# Altium footprint library SG__PCB_HOLE_Connector.PcbLib: 174 footprints (part 10 of 11)
Each footprint in its own frame and in the unit in brackets; x right, y up, seen from the top. Pads: shape width x height; smd on the part's side, far side on the other; paste and mask are expansions set on the pad; w line width, h text height; cw(c..) or ccw(c..) is an arc to the next point about the centre after c.
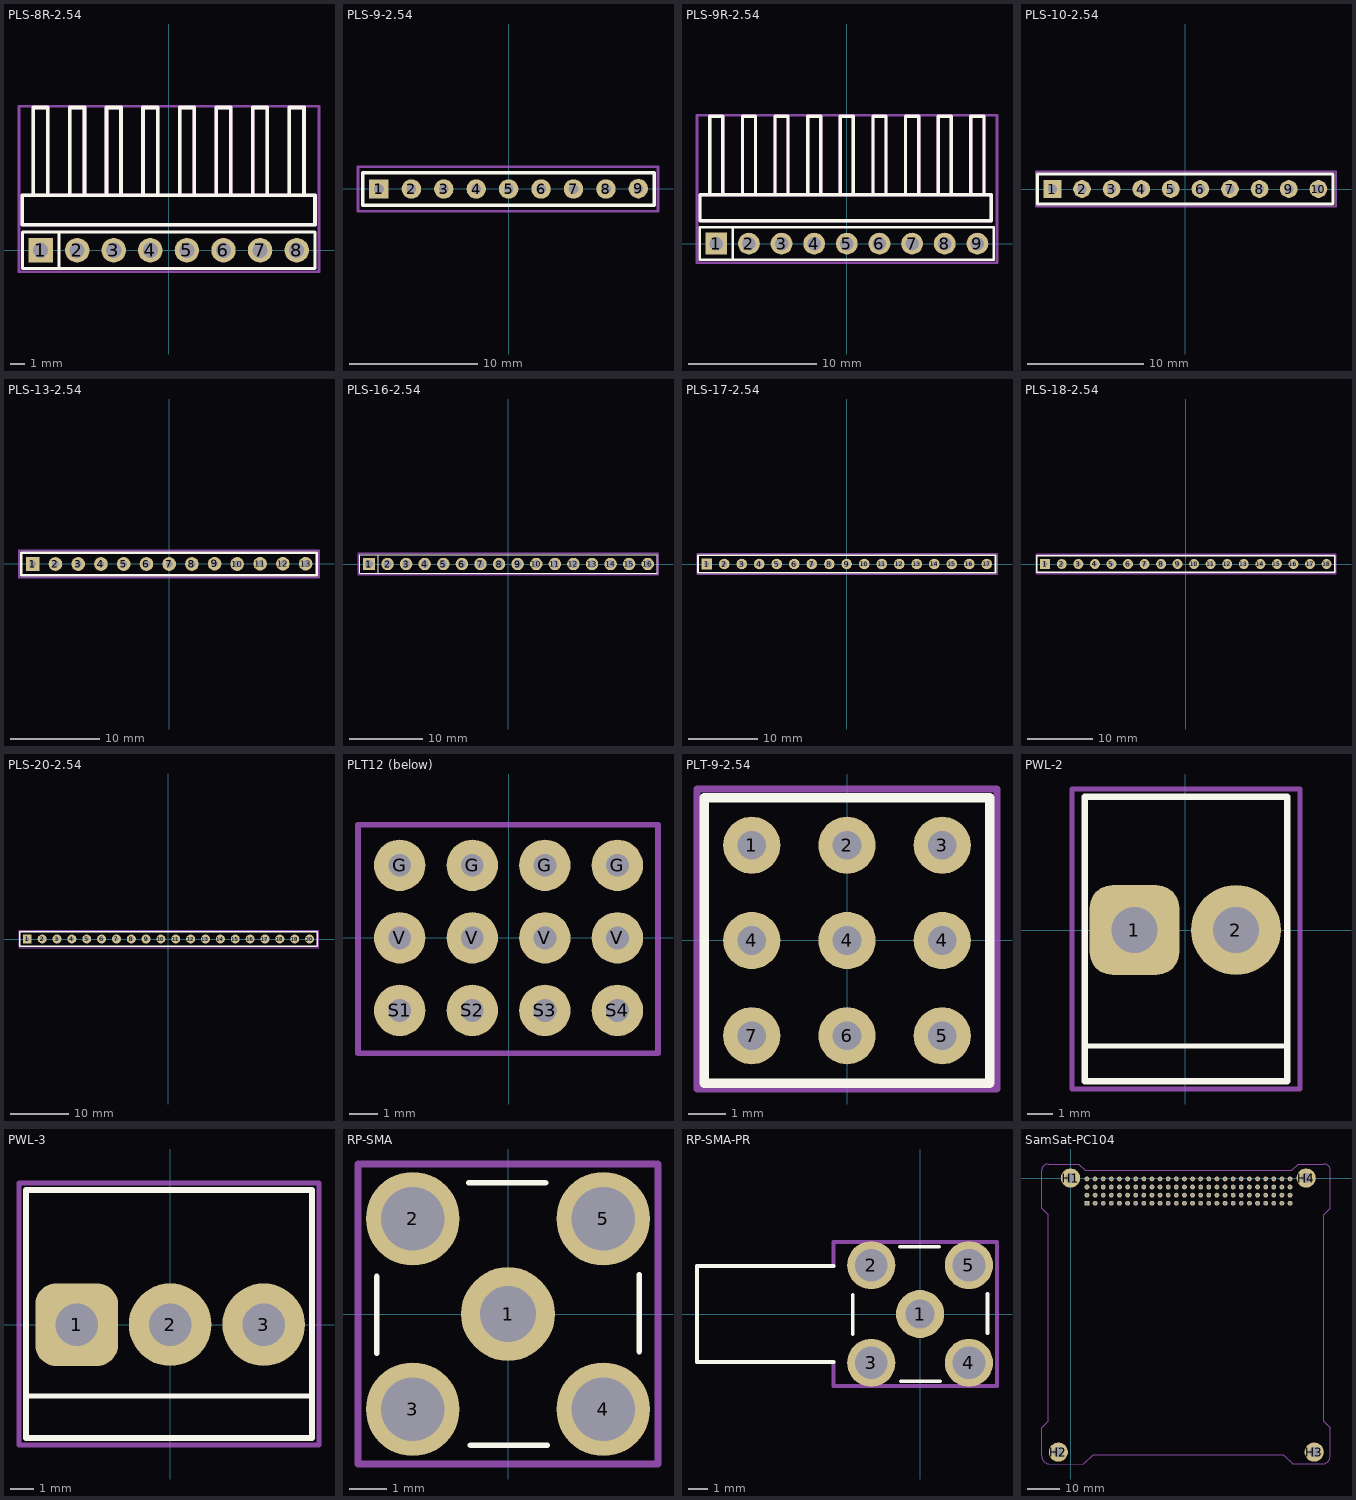
[diagram p9: the footprints below, top view; thin cyan lines are the x and y axes]

## PLS-8R-2.54 [mm]
pads (8):
  rect 1.7x1.7 hole 1.05 mask+0.05: 1(-8.89,0)
  round 1.7 hole 1.05 mask+0.05: 2(-6.35,0) 3(-3.81,0) 4(-1.27,0) 5(1.27,0) 6(3.81,0) 7(6.35,0) 8(8.89,0)
Top Overlay:
  lines w0.2: -7.62,-1.27 -7.62,1.27 ; -10.16,-1.27 -10.16,1.27 10.16,1.27 10.16,-1.27 -10.16,-1.27
  lines w0.254: -9.398,3.81 -9.398,9.906 -8.382,9.906 -8.382,3.81 ; -6.858,3.81 -6.858,9.906 -5.842,9.906 -5.842,3.81 ; -4.318,3.81 -4.318,9.906 -3.302,9.906 -3.302,3.81 ; -1.778,3.81 -1.778,9.906 -0.762,9.906 -0.762,3.81 ; 0.762,3.81 0.762,9.906 1.778,9.906 1.778,3.81 ; 3.302,3.81 3.302,9.906 4.318,9.906 4.318,3.81 ; 5.842,3.81 5.842,9.906 6.858,9.906 6.858,3.81 ; 8.382,3.81 8.382,9.906 9.398,9.906 9.398,3.81 ; -10.16,1.778 -10.16,3.81 10.16,3.81 10.16,1.778 -10.16,1.778
Top Assembly:
  lines w0.254: -9.398,3.81 -9.398,9.906 -8.382,9.906 -8.382,3.81 ; -6.858,3.81 -6.858,9.906 -5.842,9.906 -5.842,3.81 ; -4.318,3.81 -4.318,9.906 -3.302,9.906 -3.302,3.81 ; -1.778,3.81 -1.778,9.906 -0.762,9.906 -0.762,3.81 ; 0.762,3.81 0.762,9.906 1.778,9.906 1.778,3.81 ; 3.302,3.81 3.302,9.906 4.318,9.906 4.318,3.81 ; 5.842,3.81 5.842,9.906 6.858,9.906 6.858,3.81 ; 8.382,3.81 8.382,9.906 9.398,9.906 9.398,3.81 ; -10.16,1.778 -10.16,3.81 10.16,3.81 10.16,1.778 -10.16,1.778
Top Courtyard:
  lines w0.2: -10.39,-1.5 10.442,-1.5 10.442,10 -10.39,10 -10.39,-1.5
3D body "PLS-1R_D1.STEP": height 3, standoff -2.5, extent -10.16,-0.354 -7.62,10.006
3D body "PLS-1R_D1.STEP": height 3, standoff -2.5, extent -7.62,-0.32 -5.08,10.04
3D body "PLS-1R_D1.STEP": height 3, standoff -2.5, extent -5.08,-0.32 -2.54,10.04
3D body "PLS-1R_D1.STEP": height 3, standoff -2.5, extent -2.54,-0.32 0,10.04
3D body "PLS-1R_D1.STEP": height 3, standoff -2.5, extent 0,-0.32 2.54,10.04
3D body "PLS-1R_D1.STEP": height 3, standoff -2.5, extent 2.54,-0.32 5.08,10.04
3D body "PLS-1R_D1.STEP": height 3, standoff -2.5, extent 5.08,-0.32 7.62,10.04
3D body "PLS-1R_D1.STEP": height 3, standoff -2.5, extent 7.636,-0.32 10.176,10.04

## PLS-9-2.54 [mil]
pads (9):
  rect 60x60 hole 30: 1(-399.91,-0.5)
  round 60 hole 30: 2(-299.91,-0.5) 3(-199.91,-0.5) 4(-99.91,-0.5) 5(0.09,-0.5) 6(100.09,-0.5) 7(200.09,-0.5) 8(300.09,-0.5) 9(399.91,0.5)
Top Overlay:
  lines w10: -54.24,-50.5 448.91,-50.5 448.91,49.5 348.91,49.5 -54.24,49.5 ; -49.91,-50.5 -449.91,-50.5 -449.91,49.5 -49.91,49.5
Top Courtyard:
  lines w7.87: -464.48,-69.4 460.72,-69.4 460.72,68.4 -464.48,68.4 -464.48,-69.4
3D body "PLS1.stp": height 336.22, standoff -118.11, extent 349.91,-49.5 449.91,50.5
3D body "PLS1.stp": height 336.22, standoff -118.11, extent -449.91,-50.5 -349.91,49.5
3D body "PLS1.stp": height 336.22, standoff -118.11, extent -349.91,-50.5 -249.91,49.5
3D body "PLS1.stp": height 336.22, standoff -118.11, extent -249.91,-50.5 -149.91,49.5
3D body "PLS1.stp": height 336.22, standoff -118.11, extent -149.91,-50.5 -49.91,49.5
3D body "PLS1.stp": height 336.22, standoff -118.11, extent -49.91,-50.5 50.09,49.5
3D body "PLS1.stp": height 336.22, standoff -118.11, extent 50.09,-50.5 150.09,49.5
3D body "PLS1.stp": height 336.22, standoff -118.11, extent 150.09,-50.5 250.09,49.5
3D body "PLS1.stp": height 336.22, standoff -118.11, extent 250.09,-50.5 350.09,49.5

## PLS-9R-2.54 [mm]
pads (9):
  rect 1.7x1.7 hole 1.05 mask+0.05: 1(-10.16,0)
  round 1.7 hole 1.05 mask+0.05: 2(-7.62,0) 3(-5.08,0) 4(-2.54,0) 5(0,0) 6(2.54,0) 7(5.08,0) 8(7.62,0) 9(10.16,0)
Top Overlay:
  lines w0.2: -8.89,-1.27 -8.89,1.27 ; -11.43,-1.27 11.43,-1.27 11.43,1.27 -11.43,1.27 -11.43,-1.27
  lines w0.254: -10.668,3.81 -10.668,9.906 -9.652,9.906 -9.652,3.81 ; -8.128,3.81 -8.128,9.906 -7.112,9.906 -7.112,3.81 ; -5.588,3.81 -5.588,9.906 -4.572,9.906 -4.572,3.81 ; -3.048,3.81 -3.048,9.906 -2.032,9.906 -2.032,3.81 ; -0.508,3.81 -0.508,9.906 0.508,9.906 0.508,3.81 ; 2.032,3.81 2.032,9.906 3.048,9.906 3.048,3.81 ; 4.572,3.81 4.572,9.906 5.588,9.906 5.588,3.81 ; 7.112,3.81 7.112,9.906 8.128,9.906 8.128,3.81 ; 9.652,3.81 9.652,9.906 10.668,9.906 10.668,3.81 ; -11.43,1.778 11.25,1.778 11.25,3.81 -11.43,3.81 -11.43,1.778
Top Assembly:
  lines w0.254: -10.668,3.81 -10.668,9.906 -9.652,9.906 -9.652,3.81 ; -8.128,3.81 -8.128,9.906 -7.112,9.906 -7.112,3.81 ; -5.588,3.81 -5.588,9.906 -4.572,9.906 -4.572,3.81 ; -3.048,3.81 -3.048,9.906 -2.032,9.906 -2.032,3.81 ; -0.508,3.81 -0.508,9.906 0.508,9.906 0.508,3.81 ; 2.032,3.81 2.032,9.906 3.048,9.906 3.048,3.81 ; 4.572,3.81 4.572,9.906 5.588,9.906 5.588,3.81 ; 7.112,3.81 7.112,9.906 8.128,9.906 8.128,3.81 ; 9.652,3.81 9.652,9.906 10.668,9.906 10.668,3.81 ; -11.43,1.778 -11.43,3.81 11.25,3.81 11.25,1.778 -11.43,1.778
Top Courtyard:
  lines w0.2: -11.66,-1.5 -11.66,10 11.687,10 11.687,-1.5 -11.66,-1.5
3D body "PLS-1R_D1.STEP": height 3, standoff -2.5, extent 8.89,-0.32 11.43,10.04
3D body "PLS-1R_D1.STEP": height 3, standoff -2.5, extent 6.366,-0.32 8.906,10.04
3D body "PLS-1R_D1.STEP": height 3, standoff -2.5, extent 3.81,-0.32 6.35,10.04
3D body "PLS-1R_D1.STEP": height 3, standoff -2.5, extent 1.27,-0.32 3.81,10.04
3D body "PLS-1R_D1.STEP": height 3, standoff -2.5, extent -1.27,-0.32 1.27,10.04
3D body "PLS-1R_D1.STEP": height 3, standoff -2.5, extent -3.81,-0.32 -1.27,10.04
3D body "PLS-1R_D1.STEP": height 3, standoff -2.5, extent -6.35,-0.32 -3.81,10.04
3D body "PLS-1R_D1.STEP": height 3, standoff -2.5, extent -8.89,-0.32 -6.35,10.04
3D body "PLS-1R_D1.STEP": height 3, standoff -2.5, extent -11.43,-0.354 -8.89,10.006

## PLS-10-2.54 [mil]
pads (10):
  rect 60x60 hole 30: 1(-449.41,0)
  round 60 hole 30: 2(-349.41,0) 3(-249.41,0) 4(-149.41,0) 5(-49.41,0) 6(50.59,0) 7(150.59,0) 8(250.59,0) 9(349.41,0) 10(449.41,0)
Top Overlay:
  lines w10: -103.74,-50 499.41,-50 499.41,50 -103.74,50 ; -99.41,-50 -499.41,-50 -499.41,50 -99.41,50
Top Courtyard:
  lines w7.87: -504.92,-59.06 -504.92,59.06 508.86,59.06 508.86,-59.06 -504.92,-59.06
3D body "PLS1.stp": height 336.22, standoff -118.11, extent -499.41,-50 -399.41,50
3D body "PLS1.stp": height 336.22, standoff -118.11, extent -399.41,-50 -299.41,50
3D body "PLS1.stp": height 336.22, standoff -118.11, extent -299.41,-50 -199.41,50
3D body "PLS1.stp": height 336.22, standoff -118.11, extent -199.41,-50 -99.41,50
3D body "PLS1.stp": height 336.22, standoff -118.11, extent -99.41,-50 0.59,50
3D body "PLS1.stp": height 336.22, standoff -118.11, extent 0.59,-50 100.59,50
3D body "PLS1.stp": height 336.22, standoff -118.11, extent 100.59,-50 200.59,50
3D body "PLS1.stp": height 336.22, standoff -118.11, extent 200.59,-50 300.59,50
3D body "PLS1.stp": height 336.22, standoff -118.11, extent 299.41,-50 399.41,50
3D body "PLS1.stp": height 336.22, standoff -118.11, extent 399.41,-50 499.41,50

## PLS-13-2.54 [mil]
pads (13):
  rect 60x60 hole 30: 1(-599.91,-0.5)
  round 60 hole 30: 2(-499.91,-0.5) 3(-399.91,-0.5) 4(-299.91,-0.5) 5(-199.91,-0.5) 6(-99.91,-0.5) 7(0.09,-0.5) 8(100.09,-0.5) 9(199.91,0.5) 10(298.91,-0.5) 11(399.91,0.5) 12(499.91,0.5) 13(599.91,0.5)
Top Overlay:
  lines w10: -254.24,-50.5 648.91,-50.5 648.91,49.5 148.91,49.5 -254.24,49.5 ; -249.91,-50.5 -649.91,-50.5 -649.91,49.5 -249.91,49.5
Top Courtyard:
  lines w7.87: -660.15,-59.56 -660.15,58.56 -650.3,58.56 658.75,58.56 658.75,-59.56 -660.15,-59.56
3D body "PLS1.stp": height 336.22, standoff -118.11, extent -649.91,-50.5 -549.91,49.5
3D body "PLS1.stp": height 336.22, standoff -118.11, extent -549.91,-50.5 -449.91,49.5
3D body "PLS1.stp": height 336.22, standoff -118.11, extent -449.91,-50.5 -349.91,49.5
3D body "PLS1.stp": height 336.22, standoff -118.11, extent -349.91,-50.5 -249.91,49.5
3D body "PLS1.stp": height 336.22, standoff -118.11, extent -249.91,-50.5 -149.91,49.5
3D body "PLS1.stp": height 336.22, standoff -118.11, extent -149.91,-50.5 -49.91,49.5
3D body "PLS1.stp": height 336.22, standoff -118.11, extent -49.91,-50.5 50.09,49.5
3D body "PLS1.stp": height 336.22, standoff -118.11, extent 50.09,-50.5 150.09,49.5
3D body "PLS1.stp": height 336.22, standoff -118.11, extent 249.91,-49.5 349.91,50.5
3D body "PLS1.stp": height 336.22, standoff -118.11, extent 349.91,-49.5 449.91,50.5
3D body "PLS1.stp": height 336.22, standoff -118.11, extent 449.91,-49.5 549.91,50.5
3D body "PLS1.stp": height 336.22, standoff -118.11, extent 549.91,-49.5 649.91,50.5
3D body "PLS1.stp": height 336.22, standoff -118.11, extent 149.91,-49.5 249.91,50.5

## PLS-16-2.54 [mm]
pads (16):
  rect 1.7x1.7 hole 1.05 mask+0.05: 1(-19.05,0)
  round 1.7 hole 1.05 mask+0.05: 2(-16.51,0) 3(-13.97,0) 4(-11.43,0) 5(-8.89,0) 6(-6.35,0) 7(-3.81,0) 8(-1.27,0) 9(1.27,0) 10(3.81,0) 11(6.35,0) 12(8.89,0) 13(11.43,0) 14(13.97,0) 15(16.51,0) 16(19.05,0)
Top Overlay:
  lines w0.15: -17.78,-1.27 -17.78,1.27 ; -20.32,-1.27 20.32,-1.27 20.32,1.27 -20.32,1.27 -20.32,-1.27
Top Courtyard:
  lines w0.2: -20.55,-1.5 -20.55,1.5 20.45,1.5 20.45,-1.5 -20.55,-1.5
3D body "PLS.STEP": height 8.44, standoff -3, extent -15.24,-1.27 -12.7,1.27
3D body "PLS.STEP": height 8.44, standoff -3, extent -20.32,-1.27 -17.78,1.27
3D body "PLS.STEP": height 8.44, standoff -3, extent -17.78,-1.27 -15.24,1.27
3D body "PLS.STEP": height 8.44, standoff -3, extent -12.7,-1.27 -10.16,1.27
3D body "PLS.STEP": height 8.44, standoff -3, extent -10.16,-1.27 -7.62,1.27
3D body "PLS.STEP": height 8.44, standoff -3, extent -7.62,-1.27 -5.08,1.27
3D body "PLS.STEP": height 8.44, standoff -3, extent -5.08,-1.27 -2.54,1.27
3D body "PLS.STEP": height 8.44, standoff -3, extent -2.54,-1.27 0,1.27
3D body "PLS.STEP": height 8.44, standoff -3, extent 0,-1.27 2.54,1.27
3D body "PLS.STEP": height 8.44, standoff -3, extent 2.54,-1.27 5.08,1.27
3D body "PLS.STEP": height 8.44, standoff -3, extent 5.08,-1.27 7.62,1.27
3D body "PLS.STEP": height 8.44, standoff -3, extent 7.62,-1.27 10.16,1.27
3D body "PLS.STEP": height 8.44, standoff -3, extent 10.16,-1.27 12.7,1.27
3D body "PLS.STEP": height 8.44, standoff -3, extent 12.7,-1.27 15.24,1.27
3D body "PLS.STEP": height 8.44, standoff -3, extent 15.24,-1.27 17.78,1.27
3D body "PLS.STEP": height 8.44, standoff -3, extent 17.78,-1.27 20.32,1.27

## PLS-17-2.54 [mil]
pads (17):
  rect 60x60 hole 30: 1(-799.41,0)
  round 60 hole 30: 2(-699.41,0) 3(-599.41,0) 4(-499.41,0) 5(-399.41,0) 6(-299.41,0) 7(-199.41,0) 8(-99.41,0) 9(-0.59,0) 10(99.41,0) 11(199.41,0) 12(299.41,0) 13(399.41,0) 14(499.41,0) 15(599.41,0) 16(699.41,0) 17(799.41,0)
Top Overlay:
  lines w10: -453.74,-50 849.41,-50 849.41,50 -453.74,50 ; -449.41,-50 -849.41,-50 -849.41,50 -449.41,50
Top Courtyard:
  lines w7.87: -854.92,-59.06 857.68,-59.06 857.68,59.06 -854.92,59.06 -854.92,-59.06
3D body "PLS1.stp": height 336.22, standoff -118.11, extent 549.41,-50 649.41,50
3D body "PLS1.stp": height 336.22, standoff -118.11, extent 649.41,-50 749.41,50
3D body "PLS1.stp": height 336.22, standoff -118.11, extent 749.41,-50 849.41,50
3D body "PLS1.stp": height 336.22, standoff -118.11, extent 49.41,-50 149.41,50
3D body "PLS1.stp": height 336.22, standoff -118.11, extent -50.59,-50 49.41,50
3D body "PLS1.stp": height 336.22, standoff -118.11, extent -149.41,-50 -49.41,50
3D body "PLS1.stp": height 336.22, standoff -118.11, extent -249.41,-50 -149.41,50
3D body "PLS1.stp": height 336.22, standoff -118.11, extent -349.41,-50 -249.41,50
3D body "PLS1.stp": height 336.22, standoff -118.11, extent -449.41,-50 -349.41,50
3D body "PLS1.stp": height 336.22, standoff -118.11, extent -549.41,-50 -449.41,50
3D body "PLS1.stp": height 336.22, standoff -118.11, extent -649.41,-50 -549.41,50
3D body "PLS1.stp": height 336.22, standoff -118.11, extent -749.41,-50 -649.41,50
3D body "PLS1.stp": height 336.22, standoff -118.11, extent -849.41,-50 -749.41,50
3D body "PLS1.stp": height 336.22, standoff -118.11, extent 149.41,-50 249.41,50
3D body "PLS1.stp": height 336.22, standoff -118.11, extent 249.41,-50 349.41,50
3D body "PLS1.stp": height 336.22, standoff -118.11, extent 349.41,-50 449.41,50
3D body "PLS1.stp": height 336.22, standoff -118.11, extent 449.41,-50 549.41,50

## PLS-18-2.54 [mil]
pads (18):
  rect 60x60 hole 30: 1(-849.41,0)
  round 60 hole 30: 2(-749.41,0) 3(-649.41,0) 4(-549.41,0) 5(-449.41,0) 6(-349.41,0) 7(-249.41,0) 8(-149.41,0) 9(-50.59,0) 10(49.41,0) 11(149.41,0) 12(249.41,0) 13(349.41,0) 14(449.41,0) 15(549.41,0) 16(649.41,0) 17(749.41,0) 18(849.41,0)
Top Overlay:
  lines w10: -503.74,-50 899.41,-50 899.41,50 -503.74,50 ; -499.41,-50 -899.41,-50 -899.41,50 -499.41,50
Top Courtyard:
  lines w7.87: -904.92,-59.06 -904.92,59.06 906.1,59.06 906.1,-59.06 -904.92,-59.06
3D body "PLS1.stp": height 336.22, standoff -118.11, extent 699.41,-50 799.41,50
3D body "PLS1.stp": height 336.22, standoff -118.11, extent 599.41,-50 699.41,50
3D body "PLS1.stp": height 336.22, standoff -118.11, extent 499.41,-50 599.41,50
3D body "PLS1.stp": height 336.22, standoff -118.11, extent 399.41,-50 499.41,50
3D body "PLS1.stp": height 336.22, standoff -118.11, extent 299.41,-50 399.41,50
3D body "PLS1.stp": height 336.22, standoff -118.11, extent 199.41,-50 299.41,50
3D body "PLS1.stp": height 336.22, standoff -118.11, extent 99.41,-50 199.41,50
3D body "PLS1.stp": height 336.22, standoff -118.11, extent -899.41,-50 -799.41,50
3D body "PLS1.stp": height 336.22, standoff -118.11, extent -799.41,-50 -699.41,50
3D body "PLS1.stp": height 336.22, standoff -118.11, extent -699.41,-50 -599.41,50
3D body "PLS1.stp": height 336.22, standoff -118.11, extent -599.41,-50 -499.41,50
3D body "PLS1.stp": height 336.22, standoff -118.11, extent -499.41,-50 -399.41,50
3D body "PLS1.stp": height 336.22, standoff -118.11, extent -399.41,-50 -299.41,50
3D body "PLS1.stp": height 336.22, standoff -118.11, extent -299.41,-50 -199.41,50
3D body "PLS1.stp": height 336.22, standoff -118.11, extent -199.41,-50 -99.41,50
3D body "PLS1.stp": height 336.22, standoff -118.11, extent -100.59,-50 -0.59,50
3D body "PLS1.stp": height 336.22, standoff -118.11, extent -0.59,-50 99.41,50
3D body "PLS1.stp": height 336.22, standoff -118.11, extent 799.41,-50 899.41,50

## PLS-20-2.54 [mil]
pads (20):
  rect 60x60 hole 30: 1(-949.41,0)
  round 60 hole 30: 2(-849.41,0) 3(-749.41,0) 4(-649.41,0) 5(-549.41,0) 6(-449.41,0) 7(-349.41,0) 8(-249.41,0) 9(-150.59,0) 10(-50.59,0) 11(49.41,0) 12(149.41,0) 13(249.41,0) 14(349.41,0) 15(449.41,0) 16(549.41,0) 17(649.41,0) 18(749.41,0) 19(849.41,0) 20(949.41,0)
Top Overlay:
  lines w10: -603.74,-50 999.41,-50 999.41,50 -603.74,50 ; -599.41,-50 -999.41,-50 -999.41,50 -599.41,50
Top Courtyard:
  lines w7.87: -1004.92,-59.06 1012.8,-59.06 1012.8,59.06 -1004.92,59.06 -1004.92,-59.06
3D body "PLS1.stp": height 336.22, standoff -118.11, extent 699.41,-50 799.41,50
3D body "PLS1.stp": height 336.22, standoff -118.11, extent -100.59,-50 -0.59,50
3D body "PLS1.stp": height 336.22, standoff -118.11, extent -200.59,-50 -100.59,50
3D body "PLS1.stp": height 336.22, standoff -118.11, extent -299.41,-50 -199.41,50
3D body "PLS1.stp": height 336.22, standoff -118.11, extent -399.41,-50 -299.41,50
3D body "PLS1.stp": height 336.22, standoff -118.11, extent -499.41,-50 -399.41,50
3D body "PLS1.stp": height 336.22, standoff -118.11, extent -599.41,-50 -499.41,50
3D body "PLS1.stp": height 336.22, standoff -118.11, extent -699.41,-50 -599.41,50
3D body "PLS1.stp": height 336.22, standoff -118.11, extent -799.41,-50 -699.41,50
3D body "PLS1.stp": height 336.22, standoff -118.11, extent -899.41,-50 -799.41,50
3D body "PLS1.stp": height 336.22, standoff -118.11, extent -999.41,-50 -899.41,50
3D body "PLS1.stp": height 336.22, standoff -118.11, extent -0.59,-50 99.41,50
3D body "PLS1.stp": height 336.22, standoff -118.11, extent 99.41,-50 199.41,50
3D body "PLS1.stp": height 336.22, standoff -118.11, extent 199.41,-50 299.41,50
3D body "PLS1.stp": height 336.22, standoff -118.11, extent 299.41,-50 399.41,50
3D body "PLS1.stp": height 336.22, standoff -118.11, extent 399.41,-50 499.41,50
3D body "PLS1.stp": height 336.22, standoff -118.11, extent 499.41,-50 599.41,50
3D body "PLS1.stp": height 336.22, standoff -118.11, extent 599.41,-50 699.41,50
3D body "PLS1.stp": height 336.22, standoff -118.11, extent 799.41,-50 899.41,50
3D body "PLS1.stp": height 336.22, standoff -118.11, extent 899.41,-50 999.41,50

## PLT12 (below) [mm]
pads (12):
  round 1.8 hole 0.8: G(-3.81,2.54) G(-1.27,2.54) G(1.27,2.54) G(3.81,2.54) S1(-3.81,-2.54) S2(-1.27,-2.54) S3(1.27,-2.54) S4(3.81,-2.54) V(-3.81,0) V(-1.27,0) V(1.27,0) V(3.81,0)
Bottom Overlay:
  lines w0.254: -5.08,-3.81 -5.08,3.81 5.08,3.81 5.08,-3.81 -5.08,-3.81
Top Courtyard:
  lines w0.2: -5.27,-4.04 -5.27,3.96 5.23,3.96 5.23,-4.04 -5.27,-4.04
3D body "PLS1.stp": height 2.5, standoff -9.04, extent -5.08,-3.81 -2.54,-1.27
3D body "PLS1.stp": height 2.5, standoff -9.04, extent -2.54,-3.81 0,-1.27
3D body "PLS1.stp": height 2.5, standoff -9.04, extent 0,-3.81 2.54,-1.27
3D body "PLS1.stp": height 2.5, standoff -9.04, extent 2.54,-3.81 5.08,-1.27
3D body "PLS1.stp": height 2.5, standoff -9.04, extent 2.54,-1.27 5.08,1.27
3D body "PLS1.stp": height 2.5, standoff -9.04, extent 0,-1.27 2.54,1.27
3D body "PLS1.stp": height 2.5, standoff -9.04, extent -2.54,-1.27 0,1.27
3D body "PLS1.stp": height 2.5, standoff -9.04, extent -5.08,-1.27 -2.54,1.27
3D body "PLS1.stp": height 2.5, standoff -9.04, extent 2.54,1.27 5.08,3.81
3D body "PLS1.stp": height 2.5, standoff -9.04, extent 0,1.27 2.54,3.81
3D body "PLS1.stp": height 2.5, standoff -9.04, extent -2.54,1.27 0,3.81
3D body "PLS1.stp": height 2.5, standoff -9.04, extent -5.08,1.27 -2.54,3.81

## PLT-9-2.54 [mil]
pads (9):
  round 60 hole 30: 1(-100,100) 2(0,100) 3(100,100) 4(-100,0) 4(0,0) 4(100,0) 5(100,-100) 6(0,-100) 7(-100,-100)
Top Overlay:
  lines w10: -150,-150 150,-150 150,150 -150,150 -150,-150
Top Courtyard:
  lines w7.87: -157.48,-155.91 -157.48,159.06 157.48,159.06 157.48,-155.91 -157.48,-155.91
3D body "PLS1.stp": height 336.22, standoff -118.11, extent 50,-150 150,-50
3D body "PLS1.stp": height 336.22, standoff -118.11, extent -50,-150 50,-50
3D body "PLS1.stp": height 336.22, standoff -118.11, extent -150,-150 -50,-50
3D body "PLS1.stp": height 336.22, standoff -118.11, extent -150,-50 -50,50
3D body "PLS1.stp": height 336.22, standoff -118.11, extent -50,-50 50,50
3D body "PLS1.stp": height 336.22, standoff -118.11, extent 50,-50 150,50
3D body "PLS1.stp": height 336.22, standoff -118.11, extent 50,50 150,150
3D body "PLS1.stp": height 336.22, standoff -118.11, extent -50,50 50,150
3D body "PLS1.stp": height 336.22, standoff -118.11, extent -150,50 -50,150

## PWL-2 [mm]
height 12
pads (2):
  rrect50% 3.5x3.5 hole 1.8: 1(-1.98,0)
  round 3.5 hole 1.8: 2(1.98,0)
Top Overlay:
  lines w0.2: -3.92,-4.528 3.98,-4.528
  lines w0.254: -3.92,-5.9 3.98,-5.9 3.98,5.2 -3.92,5.2 -3.92,-5.9
Top Courtyard:
  lines w0.2: -4.42,-6.2 4.48,-6.2 4.48,5.5 -4.42,5.5 -4.42,-6.2
3D body "PWL-2-2.step": height 14, standoff -3.3, extent -3.52,-6 3.48,5.1

## PWL-3 [mm]
height 12
pads (3):
  rrect50% 3.5x3.5 hole 1.8: 1(-3.96,0)
  round 3.5 hole 1.8: 2(0,0) 3(3.96,0)
Top Overlay:
  lines w0.2: -6.1,-3.021 5.944,-3.021
  lines w0.254: -6.1,-4.8 6,-4.8 6,5.7 -6.1,5.7 -6.1,-4.8
Top Courtyard:
  lines w0.2: -6.4,-5.1 6.3,-5.1 6.3,6 -6.4,6 -6.4,-5.1
3D body "PWL-3.step": height 13.8, standoff -3.6, extent -5.956,-4.811 5.924,5.589

## RP-SMA [mm]
pads (5):
  round 2.5 hole 1.5 mask+0.05: 1(0,0)
  round 2.5 hole 1.7 mask+0.05: 2(-2.54,2.54) 3(-2.54,-2.54) 4(2.54,-2.54) 5(2.54,2.54)
Top Overlay:
  lines w0.15: -3.5,-1.05 -3.5,0 -3.5,1 ; -1.05,3.5 0,3.5 1,3.5 ; -1,-3.5 0,-3.5 1.05,-3.5 ; 3.5,-1 3.5,0 3.5,1.05
Top Courtyard:
  lines w0.2: -4,-4 4,-4 4,4 -4,4 -4,-4

## RP-SMA-PR [mm]
pads (5):
  round 2.5 hole 1.5 mask+0.05: 1(0,0)
  round 2.5 hole 1.7 mask+0.05: 2(-2.54,2.54) 3(-2.54,-2.54) 4(2.54,-2.54) 5(2.54,2.54)
Top Overlay:
  lines w0.2: -4.5,-2.5 -11.6,-2.5 -11.6,2.5 -4.5,2.5 ; -3.5,-1.05 -3.5,0 -3.5,1 ; -1.05,3.5 0,3.5 1,3.5 ; -1,-3.5 0,-3.5 1.05,-3.5 ; 3.5,-1 3.5,0 3.5,1.05
Top Courtyard:
  lines w0.2: -11.6,-2.5 -4.5,-2.5 -4.5,-3.75 4,-3.75 4,3.75 -4.5,3.75 -4.5,2.5 -11.6,2.5 -11.6,-2.5
3D body: height 9.6, standoff 0, extent -3,-3 3,3
3D body: height 9.77, standoff 3.42, extent -11.45,-3.172 -3,3.172

## SamSat-PC104 [mm]
pads (108):
  rect 1.5x1.5 hole 1: 1(5.15,-7.88)
  round 1.5 hole 1: 2(5.15,-5.34) 3(7.69,-7.88) 4(7.69,-5.34) 5(10.23,-7.88) 6(10.23,-5.34) 7(12.77,-7.88) 8(12.77,-5.34) 9(15.31,-7.88) 10(15.31,-5.34) 11(17.85,-7.88) 12(17.85,-5.34) 13(20.39,-7.88) 14(20.39,-5.34) 15(22.93,-7.88) 16(22.93,-5.34) 17(25.47,-7.88) 18(25.47,-5.34) 19(28.01,-7.88) 20(28.01,-5.34) 21(30.55,-7.88) 22(30.55,-5.34) 23(33.09,-7.88) 24(33.09,-5.34) 25(35.63,-7.88) 26(35.63,-5.34) 27(38.17,-7.88) 28(38.17,-5.34) 29(40.71,-7.88) 30(40.71,-5.34) 31(43.25,-7.88) 32(43.25,-5.34) 33(45.79,-7.88) 34(45.79,-5.34) 35(48.33,-7.88) 36(48.33,-5.34) 37(50.87,-7.88) 38(50.87,-5.34) 39(53.41,-7.88) 40(53.41,-5.34) 41(55.95,-7.88) 42(55.95,-5.34) 43(58.49,-7.88) 44(58.49,-5.34) 45(61.03,-7.88) 46(61.03,-5.34) 47(63.57,-7.88) 48(63.57,-5.34) 49(66.11,-7.88) 50(66.11,-5.34) 51(68.65,-7.88) 52(68.65,-5.34) 53(5.15,-2.8) 54(5.15,-0.26) 55(7.69,-2.8) 56(7.69,-0.26) 57(10.23,-2.8) 58(10.23,-0.26) 59(12.77,-2.8) 60(12.77,-0.26) 61(15.31,-2.8) 62(15.31,-0.26) 63(17.85,-2.8) 64(17.85,-0.26) 65(20.39,-2.8) 66(20.39,-0.26) 67(22.93,-2.8) 68(22.93,-0.26) 69(25.47,-2.8) 70(25.47,-0.26) 71(28.01,-2.8) 72(28.01,-0.26) 73(30.55,-2.8) 74(30.55,-0.26) 75(33.09,-2.8) 76(33.09,-0.26) 77(35.63,-2.8) 78(35.63,-0.26) 79(38.17,-2.8) 80(38.17,-0.26) 81(40.71,-2.8) 82(40.71,-0.26) 83(43.25,-2.8) 84(43.25,-0.26) 85(45.79,-2.8) 86(45.79,-0.26) 87(48.33,-2.8) 88(48.33,-0.26) 89(50.87,-2.8) 90(50.87,-0.26) 91(53.41,-2.8) 92(53.41,-0.26) 93(55.95,-2.8) 94(55.95,-0.26) 95(58.49,-2.8) 96(58.49,-0.26) 97(61.03,-2.8) 98(61.03,-0.26) 99(63.57,-2.8) 100(63.57,-0.26) 101(66.11,-2.8) 102(66.11,-0.26) 103(68.65,-2.8) 104(68.65,-0.26)
  round 6 hole 3.2: H1(0,0) H2(-3.8,-85.7) H3(76.2,-85.7) H4(73.7,0)
Board Shape:
  lines w0.254: -7.013,-76.129 -7.013,-11.529 -9.03,-9.512 -9.03,2.4 cw(c-7.03,2.4) -7.03,4.4 2.533,4.4 4.55,2.383 69.15,2.383 71.167,4.4 79.27,4.4 cw(c79.27,2.4) 81.27,2.4 81.27,-9.512 79.253,-11.529 79.253,-76.129 ; -7.013,-76.123 -9.03,-78.14 -9.03,-86.892 ccw(c-6.5,-86.892) -6.5,-89.422 4.175,-89.417 7.125,-86.467 66.55,-86.467 69.5,-89.417 78.729,-89.417 ccw(c78.718,-86.865) 81.27,-86.855 81.27,-78.14 79.253,-76.123
3D body "PC104-52.stp": height 12.23, standoff -11.77, extent 3.74,-9.083 69.78,-4.003
3D body "PC104-52.stp": height 12.23, standoff -11.77, extent 3.74,-4.003 69.78,1.077